# Altium footprint library CDPcomponents.PcbLib: 40 footprints (part 3 of 3)
Each footprint in its own frame and in the unit in brackets; x right, y up, seen from the top. Pads: shape width x height; smd on the part's side, far side on the other; paste and mask are expansions set on the pad; w line width, h text height; cw(c..) or ccw(c..) is an arc to the next point about the centre after c.
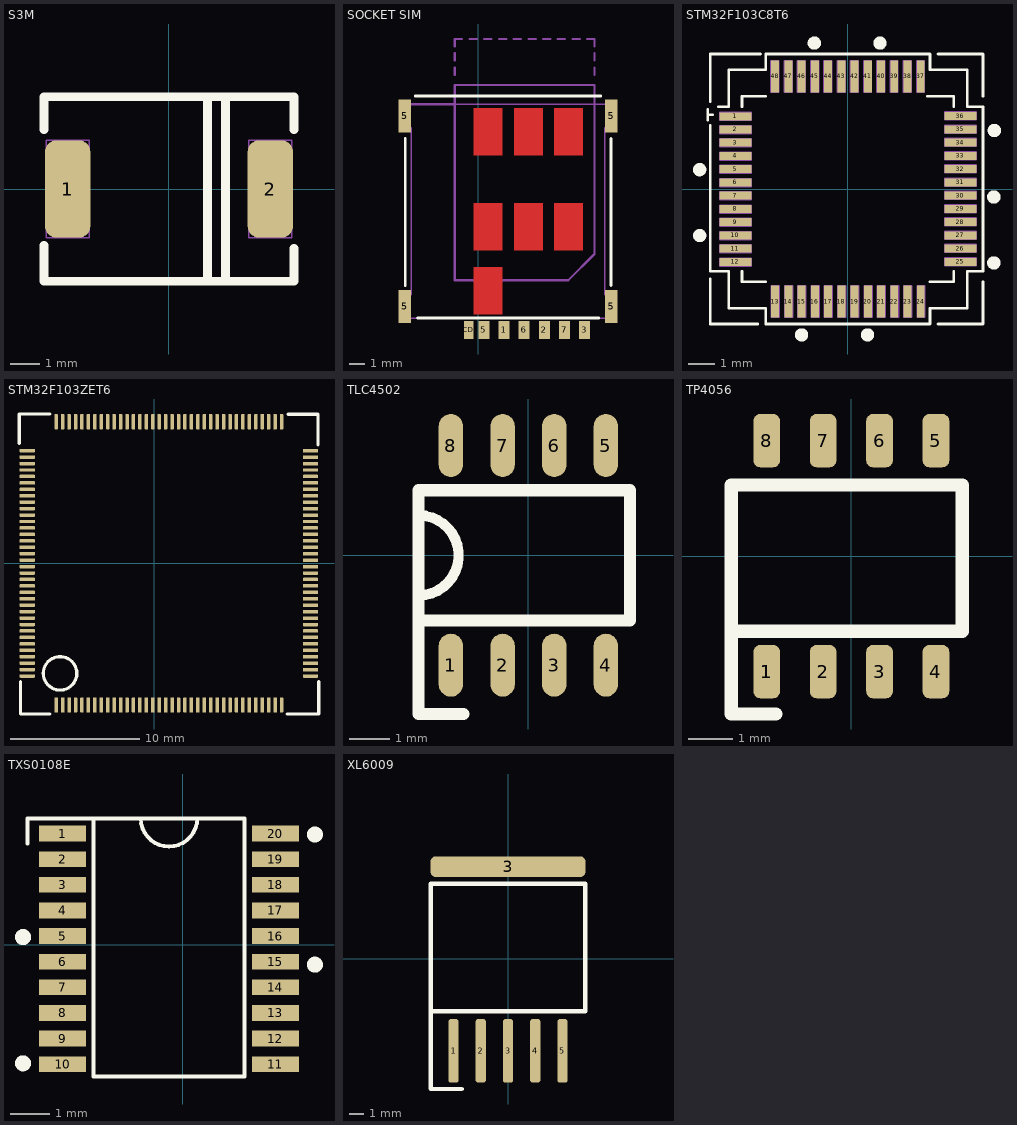
[diagram p2: the footprints below, top view; thin cyan lines are the x and y axes]

## S3M [mm]
pads (2):
  rrect50% 1.524x3.27 smd: 1(-3.405,0) 2(3.405,0)
Top Overlay:
  lines w0.3: -4.2,-1.9 -4.2,-3.1 4.2,-3.1 4.2,-2 ; -4.2,2 -4.2,3.1 4.2,3.1 4.2,2 ; 1.3,-3 1.3,2.9 ; 1.9,-3.1 1.9,2.9
Mechanical 1:
  lines w0.05: -4.131,-1.635 -4.131,1.635 -2.679,1.635 -2.679,-1.635 -4.131,-1.635 ; 2.679,-1.635 4.131,-1.635 4.131,1.635 2.679,1.635 2.679,-1.635
3D body "S3M.stp": height 2.85, standoff 0.2, extent -3.975,-2.95 3.975,2.95

## SOCKET SIM [mm]
pads (11):
  rect 0.7x1.14 smd: 1(1.63,2.2) 2(4.17,2.2) 3(6.71,2.2) 5(0.36,2.2) 6(2.9,2.2) 7(5.44,2.2)
  rect 0.8x2.1 smd: 5(-4.62,3.68) 5(-4.62,15.68) 5(8.38,3.68) 5(8.38,15.68)
  rect 0.6x1.14 smd: CD(-0.59,2.2)
Top Layer:
  pour cut-out: 1.52,6.155 1.52,3.205 -0.28,3.205 -0.28,6.155
  pour cut-out: 6.6,10.18 6.6,7.23 4.8,7.23 4.8,10.18
  pour cut-out: 4.06,10.18 4.06,7.23 2.26,7.23 2.26,10.18
  pour cut-out: 1.52,10.18 1.52,7.23 -0.28,7.23 -0.28,10.18
  pour cut-out: 1.52,16.155 1.52,13.205 -0.28,13.205 -0.28,16.155
  pour cut-out: 4.06,16.155 4.06,13.205 2.26,13.205 2.26,16.155
  pour cut-out: 6.6,16.155 6.6,13.205 4.8,13.205 4.8,16.155
Top Overlay:
  lines w0.178: -4.593,4.994 -4.593,14.265 ; -3.958,16.932 7.726,16.932 ; -3.831,2.962 7.599,2.962 ; 8.361,4.994 8.361,14.265
Top 3D Body:
  lines w0.1: -4.62,2.93 8.38,2.93 8.38,4.43 7.98,4.43 7.98,14.93 8.38,14.93 8.38,16.43 -4.62,16.43 -4.62,14.93 -4.22,14.93 -4.22,4.43 -4.62,4.43 -4.62,2.93
  lines w0.15: -4.22,16.43 -1.47,16.43
Top Courtyard:
  lines w0.15: -1.47,18.28 -1.47,18.73 ; -1.47,19.18 -1.47,19.63 ; -1.47,20.08 -1.47,20.53 -1.02,20.53 ; -0.542,20.53 -0.092,20.53 ; 0.386,20.53 0.836,20.53 ; 1.313,20.53 1.763,20.53 ; 2.241,20.53 2.691,20.53 ; 3.169,20.53 3.619,20.53 ; 4.097,20.53 4.547,20.53 ; 5.025,20.53 5.475,20.53 ; 5.952,20.53 6.402,20.53 ; 6.88,20.53 7.33,20.53 7.33,20.08 ; 7.33,18.28 7.33,18.73 ; 7.33,19.18 7.33,19.63 ; -1.47,5.33 5.68,5.33 7.33,6.98 7.33,17.63 -1.47,17.63 -1.47,5.33
3D body: height 0.4, standoff 0.01, extent -0.74,1.98 -0.44,2.93
3D body: height 0.4, standoff 0.01, extent 0.21,1.98 0.51,2.93
3D body: height 0.4, standoff 0.01, extent 1.48,1.98 1.78,2.93
3D body: height 0.4, standoff 0.01, extent 2.75,1.98 3.05,2.93
3D body: height 0.4, standoff 0.01, extent 4.02,1.98 4.32,2.93
3D body: height 0.4, standoff 0.01, extent 5.29,1.98 5.59,2.93
3D body: height 0.4, standoff 0.01, extent 6.56,1.98 6.86,2.93
3D body: height 1.35, standoff 0.1, extent -4.22,2.93 7.98,16.43
3D body: height 0.3, standoff 0.1, extent 7.98,14.93 8.38,16.43
3D body: height 0.3, standoff 0.1, extent -4.62,14.93 -4.22,16.43
3D body: height 0.3, standoff 0.1, extent -4.62,2.93 -4.22,4.43
3D body: height 0.3, standoff 0.1, extent 7.98,2.93 8.38,4.43

## STM32F103C8T6 [mm]
pads (48):
  rect 1.2x0.3 smd: 1(-4.25,2.74) 2(-4.25,2.25) 3(-4.25,1.75) 4(-4.25,1.25) 5(-4.25,0.75) 6(-4.25,0.25) 7(-4.25,-0.25) 8(-4.25,-0.75) 9(-4.25,-1.25) 10(-4.25,-1.75) 11(-4.25,-2.25) 12(-4.25,-2.75) 25(4.25,-2.75) 26(4.25,-2.25) 27(4.25,-1.75) 28(4.25,-1.25) 29(4.25,-0.75) 30(4.25,-0.25) 31(4.25,0.25) 32(4.25,0.75) 33(4.25,1.25) 34(4.25,1.75) 35(4.25,2.25) 36(4.25,2.75)
  rect 0.3x1.2 smd: 13(-2.75,-4.25) 14(-2.25,-4.25) 15(-1.75,-4.25) 16(-1.25,-4.25) 17(-0.75,-4.25) 18(-0.25,-4.25) 19(0.25,-4.25) 20(0.75,-4.25) 21(1.25,-4.25) 22(1.75,-4.25) 23(2.25,-4.25) 24(2.75,-4.25) 37(2.75,4.25) 38(2.25,4.25) 39(1.75,4.25) 40(1.25,4.25) 41(0.75,4.25) 42(0.25,4.25) 43(-0.25,4.25) 44(-0.75,4.25) 45(-1.25,4.25) 46(-1.75,4.25) 47(-2.25,4.25) 48(-2.75,4.25)
Top Overlay:
  circle w0.3: c-5.6,0.73 r0.1
  circle w0.3: c-5.6,-1.76 r0.1
  circle w0.3: c-1.75,-5.51 r0.1
  circle w0.3: c0.74,-5.51 r0.1
  circle w0.3: c5.51,-2.79 r0.1
  circle w0.3: c5.51,-0.3 r0.1
  circle w0.3: c5.53,2.21 r0.1
  circle w0.3: c1.21,5.51 r0.1
  circle w0.3: c-1.27,5.51 r0.1
  lines w0.1: -5.3,2.6 -5.3,3 ; -5.3,2.8 -5.1,2.8 ; -5.2,-3.4 -5.2,-5.1 -3.4,-5.1 ; -5.2,2.4 -5.2,-3.1 -4.5,-3.1 -4.5,-4.5 -3.1,-4.5 -3.1,-5.1 -0.9,-5.1 3.1,-5.1 3.1,-4.5 4.5,-4.5 4.5,-3.1 5.1,-3.1 5.1,3.1 4.5,3.1 4.5,4.5 3.1,4.5 3.1,5.1 -3.1,5.1 -3.1,4.5 -4.5,4.5 -4.5,3.1 -4.9,3.1 ; -5.2,3.3 -5.2,5.1 -3.3,5.1 ; -4,-3.1 -4,-3.5 -3.1,-3.5 ; -4,3.1 -4,3.5 -3.1,3.5 ; 3,3.5 4,3.5 4,3.1 ; 3.1,-3.5 4,-3.5 4,-3.1 ; 3.4,-5.1 5.1,-5.1 5.1,-3.5 ; 3.4,5.1 5.1,5.1 5.1,3.5
Mechanical 1:
  drawing of 192 lines, arcs and shapes, not listed
3D body "stm32f030c8t6.stp": height 1.48, standoff 0, extent -4.503,-4.462 4.497,4.538

## STM32F103ZET6 [mm] "STM32F103ZET6 - LQFP144"
height 12
pads (144):
  rrect50% 0.27x1.2 smd: 1(-7.625,-11) 2(-7.125,-11) 3(-6.625,-11) 4(-6.125,-11) 5(-5.625,-11) 6(-5.125,-11) 7(-4.625,-11) 8(-4.125,-11) 9(-3.625,-11) 10(-3.125,-11) 11(-2.625,-11) 12(-2.125,-11) 13(-1.625,-11) 14(-1.125,-11) 15(-0.625,-11) 16(-0.125,-11) 17(0.375,-11) 18(0.875,-11) 19(1.375,-11) 20(1.875,-11) 21(2.375,-11) 22(2.875,-11) 23(3.375,-11) 24(3.875,-11) 25(4.375,-11) 26(4.875,-11) 27(5.375,-11) 28(5.875,-11) 29(6.375,-11) 30(6.875,-11) 31(7.375,-11) 32(7.875,-11) 33(8.375,-11) 34(8.875,-11) 35(9.375,-11) 36(9.875,-11) 73(9.875,11) 74(9.375,11) 75(8.875,11) 76(8.375,11) 77(7.875,11) 78(7.375,11) 79(6.875,11) 80(6.375,11) 81(5.875,11) 82(5.375,11) 83(4.875,11) 84(4.375,11) 85(3.875,11) 86(3.375,11) 87(2.875,11) 88(2.375,11) 89(1.875,11) 90(1.375,11) 91(0.875,11) 92(0.375,11) 93(-0.125,11) 94(-0.625,11) 95(-1.125,11) 96(-1.625,11) 97(-2.125,11) 98(-2.625,11) 99(-3.125,11) 100(-3.625,11) 101(-4.125,11) 102(-4.625,11) 103(-5.125,11) 104(-5.625,11) 105(-6.125,11) 106(-6.625,11) 107(-7.125,11) 108(-7.625,11)
  rrect50% 1.2x0.27 smd: 37(12.125,-8.75) 38(12.125,-8.25) 39(12.125,-7.75) 40(12.125,-7.25) 41(12.125,-6.75) 42(12.125,-6.25) 43(12.125,-5.75) 44(12.125,-5.25) 45(12.125,-4.75) 46(12.125,-4.25) 47(12.125,-3.75) 48(12.125,-3.25) 49(12.125,-2.75) 50(12.125,-2.25) 51(12.125,-1.75) 52(12.125,-1.25) 53(12.125,-0.75) 54(12.125,-0.25) 55(12.125,0.25) 56(12.125,0.75) 57(12.125,1.25) 58(12.125,1.75) 59(12.125,2.25) 60(12.125,2.75) 61(12.125,3.25) 62(12.125,3.75) 63(12.125,4.25) 64(12.125,4.75) 65(12.125,5.25) 66(12.125,5.75) 67(12.125,6.25) 68(12.125,6.75) 69(12.125,7.25) 70(12.125,7.75) 71(12.125,8.25) 72(12.125,8.75) 109(-9.875,8.75) 110(-9.875,8.25) 111(-9.875,7.75) 112(-9.875,7.25) 113(-9.875,6.75) 114(-9.875,6.25) 115(-9.875,5.75) 116(-9.875,5.25) 117(-9.875,4.75) 118(-9.875,4.25) 119(-9.875,3.75) 120(-9.875,3.25) 121(-9.875,2.75) 122(-9.875,2.25) 123(-9.875,1.75) 124(-9.875,1.25) 125(-9.875,0.75) 126(-9.875,0.25) 127(-9.875,-0.25) 128(-9.875,-0.75) 129(-9.875,-1.25) 130(-9.875,-1.75) 131(-9.875,-2.25) 132(-9.875,-2.75) 133(-9.875,-3.25) 134(-9.875,-3.75) 135(-9.875,-4.25) 136(-9.875,-4.75) 137(-9.875,-5.25) 138(-9.875,-5.75) 139(-9.875,-6.25) 140(-9.875,-6.75) 141(-9.875,-7.25) 142(-9.875,-7.75) 143(-9.875,-8.25) 144(-9.875,-8.75)
Top Overlay:
  circle w0.254: c-7.323,-8.543 r1.3
  lines w0.254: -10.5,9.3 -10.5,11.6 -8.1,11.6 ; -10.4,-9.2 -10.4,-11.7 -8.1,-11.7 ; 10.3,-11.7 12.768,-11.7 12.768,-9.2 ; 10.4,11.59 12.7,11.59 12.7,9.2
3D body "STM32F103ZET6TR.stp": height 1.6, standoff 0, extent -9.876,-10.994 12.124,11.006

## TLC4502 [mm]
pads (8):
  oval 0.6x1.55 smd: 1(-1.905,-2.7) 2(-0.635,-2.7) 3(0.635,-2.7) 4(1.905,-2.7) 5(1.905,2.7) 6(0.635,2.7) 7(-0.635,2.7) 8(-1.905,2.7)
Top Overlay:
  lines w0.254: -2.7,-0.985 ccw(c-2.7,0) -2.7,0.985
  lines w0.3: -1.6,-3.9 -2.7,-3.9 -2.7,-1.6 ; -2.7,-1.6 2.5,-1.6 2.5,1.6 -2.7,1.6 -2.7,-1.6
3D body "TLC4502CD.stp": height 1.63, standoff 0, extent -2.451,-2.974 2.451,3.049

## TP4056 [mm]
pads (9):
  rrect50% 0.6x1.2 smd: 1(-1.905,-2.6) 1(-1.905,-2.6) 2(-0.635,-2.6) 3(0.635,-2.6) 4(1.905,-2.6) 5(1.905,2.6) 6(0.635,2.6) 7(-0.635,2.6) 8(-1.905,2.6)
Top Overlay:
  lines w0.3: -2.5,-1.691 -2.7,-1.691 ; -1.696,-3.554 -2.7,-3.554 -2.7,-1.691 ; -2.7,-1.691 -2.7,1.6 2.5,1.6 2.5,-1.691 -2.7,-1.691
3D body "TP4056A.stp": height 1.75, standoff 0, extent -2.45,-3 2.45,3

## TXS0108E [mm]
pads (20):
  rect 1.2x0.4 smd: 1(-3.044,2.825) 2(-3.044,2.175) 3(-3.044,1.525) 4(-3.044,0.875) 5(-3.044,0.225) 6(-3.044,-0.425) 7(-3.044,-1.075) 8(-3.044,-1.725) 9(-3.044,-2.375) 10(-3.044,-3.025) 11(2.356,-3.025) 12(2.356,-2.375) 13(2.356,-1.725) 14(2.356,-1.075) 15(2.356,-0.425) 16(2.356,0.225) 17(2.356,0.875) 18(2.356,1.525) 19(2.356,2.175) 20(2.356,2.825)
Top Overlay:
  circle w0.2: c3.356,2.8 r0.103
  circle w0.2: c3.356,-0.5 r0.103
  circle w0.2: c-4.044,-3 r0.103
  circle w0.2: c-4.044,0.2 r0.103
  lines w0.1: -3.934,2.57 -3.934,3.21 -2.254,3.21 ; -2.254,-3.33 -2.254,3.21 ; -2.244,-3.34 1.566,-3.34 1.566,3.21 -2.254,3.21 ; -1.061,3.2 ccw(c-0.344,3.21) 0.373,3.202
3D body "TXS0108EPWR.stp": height 1.2, standoff 0, extent -3.494,-3.325 2.906,3.175

## XL6009 [mm]
pads (6):
  rrect50% 0.7x4.32 smd: 1(-3.7,-6.255) 2(-1.85,-6.255) 3(0,-6.255) 4(1.85,-6.255) 5(3.7,-6.255)
  rrect50% 10.54x1.4 smd: 3(0,6.255)
Top Overlay:
  lines w0.3: -3.139,-8.845 -5.228,-8.845 -5.24,-8.833 -5.24,-3.556 ; -5.24,-3.556 -5.24,5.08 -0.255,5.08 5.24,5.08 5.24,-3.556 -5.24,-3.556